# Altium footprint library main.PcbLib: 208 footprints (part 11 of 13)
Each footprint in its own frame and in the unit in brackets; x right, y up, seen from the top. Pads: shape width x height; smd on the part's side, far side on the other; paste and mask are expansions set on the pad; w line width, h text height; cw(c..) or ccw(c..) is an arc to the next point about the centre after c.
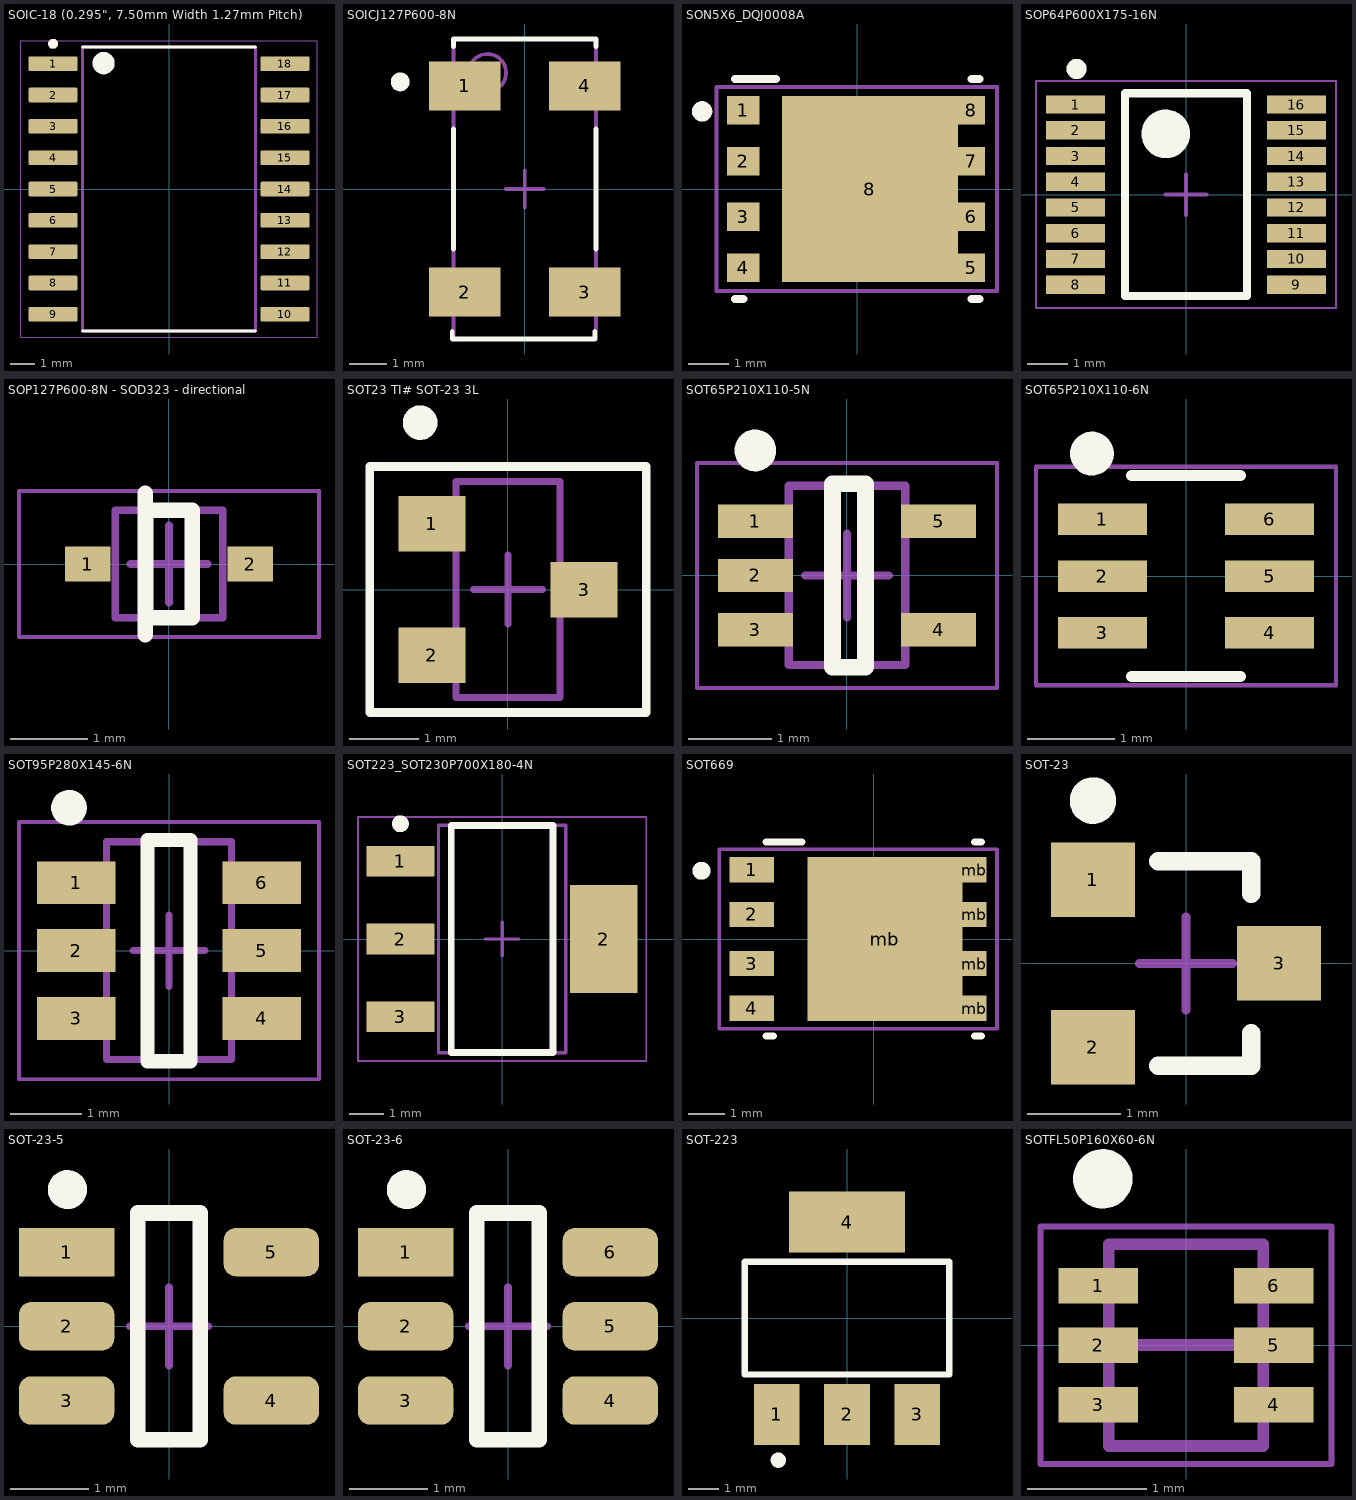
[diagram p10: the footprints below, top view; thin cyan lines are the x and y axes]

## SOIC-18 (0.295", 7.50mm Width 1.27mm Pitch) [mm] "SOIC-18 (0.295\", 7.50mm Width 1.27mm Pitch)"
height 1.1
pads (18):
  rrect25% 2x0.6 smd: 1(-4.7,5.08) 2(-4.7,3.81) 3(-4.7,2.54) 4(-4.7,1.27) 5(-4.7,0) 6(-4.7,-1.27) 7(-4.7,-2.54) 8(-4.7,-3.81) 9(-4.7,-5.08) 10(4.7,-5.08) 11(4.7,-3.81) 12(4.7,-2.54) 13(4.7,-1.27) 14(4.7,0) 15(4.7,1.27) 16(4.7,2.54) 17(4.7,3.81) 18(4.7,5.08)
Top Overlay:
  circle w0.6: c-2.65,5.1 r0.15
  circle w0.2: c-4.7,5.885 r0.1
  lines w0.127: -3.5,-5.75 3.5,-5.75 ; -3.5,5.75 3.5,5.75
Mechanical 7:
  text ".Designator" at -1.85,-0.35 h1.52
Mechanical 13:
  circle w0.2: c-4.7,5.885 r0.1
  lines w0.127: -3.5,-5.75 -3.5,5.75 3.5,5.75 3.5,-5.75 -3.5,-5.75
Mechanical 15:
  lines w0.05: -6,-6 -6,6 6,6 6,-6 -6,-6
3D body "User Library-SO-18W.STEP": height 2.48, standoff 0, extent -5.155,-5.79 5.155,5.79

## SOICJ127P600-8N [mm] "Crystal - ABS25 32.768kHz"
height 2.5
pads (4):
  rect 1.9x1.3 smd: 1(-1.6,2.75) 2(-1.6,-2.75) 3(1.6,-2.75) 4(1.6,2.75)
Top Overlay:
  circle w0.25: c-3.324,2.856 r0.125
  lines w0.127: -1.934,-3.8 -1.934,-4 1.866,-4 1.866,-3.8 ; -1.9,-1.6 -1.9,1.6 ; -1.9,3.8 -1.9,4 1.9,4 1.9,3.8 ; 1.9,-1.6 1.9,1.6
Mechanical 7:
  text ".Designator" at -1.969,-0.719 h1.52
Mechanical 13:
  circle w0.1: c-1,3.1 r0.5
  lines w0.1: -1.9,-4 -1.9,4 1.9,4 1.9,-4 -1.9,-4
Mechanical 15:
  lines w0.05: -1.9,-4 -1.9,4 1.9,4 1.9,-4 -1.9,-4
  lines w0.1: -0.5,0 0.5,0 ; -0.483,0 0.482,0 ; 0,-0.5 0,0.5 ; 0,-0.381 0,0.381
3D body: height 2.5, standoff 0.1, extent -1.9,-4 1.9,4

## SON5X6_DQJ0008A [mm] "TI SON5X6 package MOSFET"
height 0.025
pads (9):
  rect 0.8x0.7 smd paste-0.09: 1(-2.795,1.93) 2(-2.795,0.685) 3(-2.795,-0.685) 4(-2.795,-1.93)
  rect 0.68x0.7 smd paste-0.09: 5(2.795,-1.93) 6(2.795,-0.685) 7(2.795,0.685) 8(2.795,1.93)
  rect 4.32x4.56 smd paste+0: 8(0.308,0)
Top Overlay:
  circle w0.25: c-3.81,1.905 r0.125
  lines w0.2: -3,-2.7 -2.8,-2.7 ; -3,2.7 -2,2.7 ; 2.8,-2.7 3,-2.7 ; 2.8,2.7 3,2.7
Top Paste:
  rectangle: 0.693,-1.955 1.927,-0.385
  rectangle: 0.693,0.385 1.927,1.955
  rectangle: -1.392,-1.955 0.193,-0.385
  rectangle: -1.392,0.385 0.193,1.955
Top Solder:
  region: -1.189,-2.193 -1.19,-2.183 -1.19,2.183 -1.189,2.193 -1.186,2.203 -1.181,2.212 -1.175,2.22 -1.167,2.226 -1.158,2.231 -1.148,2.234 -1.138,2.235 2.238,2.235 2.248,2.234 2.258,2.231 2.267,2.226 2.275,2.22 2.281,2.212 2.286,2.203 2.289,2.193 2.29,2.183 2.29,-2.183 2.289,-2.193 2.286,-2.203 2.281,-2.212 2.275,-2.22 2.267,-2.226 2.258,-2.231 2.248,-2.234 2.238,-2.235 -1.138,-2.235 -1.148,-2.234 -1.158,-2.231 -1.167,-2.226 -1.175,-2.22 -1.181,-2.212 -1.186,-2.203
  region: 2.25,0.84 2.25,0.43 2.475,0.43 2.475,0.84
  region: 2.25,2.11 2.25,1.7 2.475,1.7 2.475,2.11
  region: 2.25,-1.7 2.25,-2.11 2.475,-2.11 2.475,-1.7
  region: 2.25,-0.43 2.25,-0.84 2.475,-0.84 2.475,-0.43
Mechanical 7:
  text ".Designator" at -2.413,-1.778 h1.52
Mechanical 15:
  lines w0.1: -3.457,-2.5 3.429,-2.5 3.429,2.5 -3.457,2.5 -3.457,-2.5
3D body "DQJ0008A.stp": height 1.15, standoff 0, extent -3.175,-2.436 3.085,2.464

## SOP64P600X175-16N [mm] "FT230XS-R SOP, 16-Leads, Body 4.90x3.90mm, Pitch 0.64mm, IPC Medium Density"
height 1.76
pads (16):
  rect 1.45x0.45 smd: 1(-2.725,2.222) 2(-2.725,1.587) 3(-2.725,0.953) 4(-2.725,0.318) 5(-2.725,-0.318) 6(-2.725,-0.953) 7(-2.725,-1.587) 8(-2.725,-2.222) 9(2.725,-2.222) 10(2.725,-1.587) 11(2.725,-0.953) 12(2.725,-0.318) 13(2.725,0.318) 14(2.725,0.953) 15(2.725,1.587) 16(2.725,2.222)
Top Overlay:
  circle w0.6: c-0.5,1.5 r0.3
  circle w0.25: c-2.7,3.1 r0.125
  lines w0.2: -1.5,-2.5 1.5,-2.5 1.5,2.5 -1.5,2.5 -1.5,-2.5
Mechanical 7:
  text ".Designator" at -1.295,-0.74 h0.76
Mechanical 15:
  lines w0.05: -3.7,-2.8 3.7,-2.8 3.7,2.8 -3.7,2.8 -3.7,-2.8
  lines w0.1: -0.5,0 0.5,0 ; 0,-0.5 0,0.5
3D body "User Library-SSOP16.STEP": height 1.05, standoff -0.05, extent -2.997,-2.439 2.997,2.539

## SOP127P600-8N - SOD323 - directional [mm] "SOD323 - directional"
height 1.1
pads (2):
  rect 0.59x0.45 smd: 1(-1.055,0) 2(1.055,0)
Top Overlay:
  lines w0.2: -0.31,-0.92 -0.31,0.92 ; -0.3,-0.7 -0.3,0.7 0.3,0.7 0.3,-0.7 -0.3,-0.7
Mechanical 7:
  text ".Designator" at -1.143,-0.254 h0.76
Mechanical 13:
  lines w0.1: -0.7,-0.7 -0.7,0.7 0.7,0.7 0.7,-0.7 -0.7,-0.7
Mechanical 15:
  lines w0.05: -1.95,-0.95 -1.95,0.95 1.95,0.95 1.95,-0.95 -1.95,-0.95
  lines w0.1: -0.5,0 0.5,0 ; 0,-0.5 0,0.5
3D body: height 1.1, standoff 0.1, extent -0.7,-0.7 0.7,0.7

## SOT23 TI# SOT-23 3L [mm] "SOT23, 3-Leads, Body 2.92x2.40mm, Pitch 0.95mm, IPC Medium Density"
height 1.2
pads (3):
  rect 0.972x0.802 smd: 1(-1.1,0.95) 2(-1.1,-0.95) 3(1.1,0)
Top Overlay:
  circle w0.25: c-1.27,2.413 r0.125
  lines w0.127: -2,-1.778 2,-1.778 2,1.778 -2,1.778 -2,-1.778
Mechanical 7:
  text ".Designator" at -1.778,-0.762 h1.52
Mechanical 13:
  lines w0.1: -0.75,-1.56 -0.75,1.56 0.75,1.56 0.75,-1.56 -0.75,-1.56
Mechanical 15:
  lines w0.05: -2,-1.8 -2,1.8 2,1.8 2,-1.8 -2,-1.8
  lines w0.1: -0.5,0 0.5,0 ; 0,-0.5 0,0.5
3D body: height 1.2, standoff 0.1, extent -0.75,-1.56 0.75,1.56

## SOT65P210X110-5N [mm] "SOT23, 5-Leads, Body 2.00x2.10mm, Pitch 0.65mm, IPC Medium Density"
height 1.1
pads (5):
  rect 0.9x0.4 smd: 1(-1.1,0.65) 2(-1.1,0) 3(-1.1,-0.65) 4(1.1,-0.65) 5(1.1,0.65)
Top Overlay:
  circle w0.25: c-1.1,1.5 r0.125
  lines w0.2: -0.175,-1.1 0.222,-1.1 0.222,1.1 -0.175,1.1 -0.175,-1.1
Mechanical 7:
  text ".Designator" at -1.247,-0.236 h0.76
Mechanical 13:
  lines w0.1: -0.7,-1.075 -0.7,1.075 0.7,1.075 0.7,-1.075 -0.7,-1.075
Mechanical 15:
  lines w0.05: -1.8,-1.35 -1.8,1.35 1.8,1.35 1.8,-1.35 -1.8,-1.35
  lines w0.1: -0.5,0 0.5,0 ; 0,-0.5 0,0.5
3D body: height 1.1, standoff 0.1, extent -0.7,-1.075 0.7,1.075

## SOT65P210X110-6N [mm]
pads (6):
  rect 1.02x0.36 smd: 1(-0.955,0.65) 2(-0.955,0) 3(-0.955,-0.65) 4(0.955,-0.65) 5(0.955,0) 6(0.955,0.65)
Top Overlay:
  circle w0.25: c-1.075,1.4 r0.125
  lines w0.127: -0.625,-1.15 0.625,-1.15 ; -0.625,1.15 0.625,1.15
Mechanical 7:
  text ".Designator" at -1.016,-0.381 h0.76
Mechanical 15:
  lines w0.05: -1.715,-1.25 1.715,-1.25 1.715,1.25 -1.715,1.25 -1.715,-1.25
3D body "User Library-SOT363-2.STEP": height 1.1, standoff 0, extent -1.2,-1.1 1.2,1.1

## SOT95P280X145-6N [mm] "SOT23, 6-Leads, Body 2.90x2.80mm, Pitch 0.95mm, IPC Medium Density"
height 1.45
pads (6):
  rect 1.1x0.6 smd: 1(-1.3,0.95) 2(-1.3,0) 3(-1.3,-0.95) 4(1.3,-0.95) 5(1.3,0) 6(1.3,0.95)
Top Overlay:
  circle w0.25: c-1.4,2 r0.125
  lines w0.2: -0.3,-1.55 -0.3,1.55 0.3,1.55 0.3,-1.55 -0.3,-1.55
Mechanical 7:
  text ".Designator" at -1.448,-0.136 h0.76
Mechanical 13:
  lines w0.1: -0.875,-1.525 0.875,-1.525 0.875,1.525 -0.875,1.525 -0.875,-1.525
Mechanical 15:
  lines w0.05: -2.1,-1.8 2.1,-1.8 2.1,1.8 -2.1,1.8 -2.1,-1.8
  lines w0.1: -0.5,0 0.5,0 ; 0,-0.5 0,0.5
3D body: height 1.45, standoff 0.25, extent -0.875,-1.525 0.875,1.525

## SOT223_SOT230P700X180-4N [mm] "SOT223, 4-Leads, Body 6.50x7.00mm (avg), Pitch 2.30mm, IPC Medium Density"
height 1.8
pads (4):
  rect 2x0.9 smd: 1(-3,2.3) 2(-3,0) 3(-3,-2.3)
  rect 2x3.2 smd: 2(3,0)
Top Overlay:
  circle w0.25: c-3,3.4 r0.125
  lines w0.2: -1.5,-3.35 -1.5,3.35 1.5,3.35 1.5,-3.35 -1.5,-3.35
Mechanical 7:
  text ".Designator" at -2.286,-0.508 h1.52
Mechanical 13:
  lines w0.1: -1.875,-3.35 -1.875,3.35 1.875,3.35 1.875,-3.35 -1.875,-3.35
Mechanical 15:
  lines w0.05: -4.25,-3.6 -4.25,3.6 4.25,3.6 4.25,-3.6 -4.25,-3.6
  lines w0.1: -0.5,0 0.5,0 ; 0,-0.5 0,0.5
3D body: height 1.8, standoff 0.02, extent -1.875,-3.35 1.875,3.35

## SOT669 [mm] "SOT669"
height 0.025
pads (9):
  rect 1.25x0.7 smd paste-0.09: 1(-3.4,1.93) 2(-3.4,0.685) 3(-3.4,-0.685) 4(-3.4,-1.93)
  rect 4.32x4.56 smd paste+0: mb(0.308,0)
  rect 0.68x0.7 smd paste-0.09: mb(2.795,-1.93) mb(2.795,-0.685) mb(2.795,0.685) mb(2.795,1.93)
Top Overlay:
  circle w0.25: c-4.8,1.9 r0.125
  lines w0.2: -3,-2.7 -2.8,-2.7 ; -3,2.7 -2,2.7 ; 2.8,-2.7 3,-2.7 ; 2.8,2.7 3,2.7
Top Paste:
  rectangle: -1.392,0.385 0.193,1.955
  rectangle: -1.392,-1.955 0.193,-0.385
  rectangle: 0.693,0.385 1.927,1.955
  rectangle: 0.693,-1.955 1.927,-0.385
Top Solder:
  region: 2.25,-0.43 2.25,-0.84 2.475,-0.84 2.475,-0.43
  region: 2.25,-1.7 2.25,-2.11 2.475,-2.11 2.475,-1.7
  region: 2.25,2.11 2.25,1.7 2.475,1.7 2.475,2.11
  region: 2.25,0.84 2.25,0.43 2.475,0.43 2.475,0.84
  region: -1.189,-2.193 -1.19,-2.183 -1.19,2.183 -1.189,2.193 -1.186,2.203 -1.181,2.212 -1.175,2.22 -1.167,2.226 -1.158,2.231 -1.148,2.234 -1.138,2.235 2.238,2.235 2.248,2.234 2.258,2.231 2.267,2.226 2.275,2.22 2.281,2.212 2.286,2.203 2.289,2.193 2.29,2.183 2.29,-2.183 2.289,-2.193 2.286,-2.203 2.281,-2.212 2.275,-2.22 2.267,-2.226 2.258,-2.231 2.248,-2.234 2.238,-2.235 -1.138,-2.235 -1.148,-2.234 -1.158,-2.231 -1.167,-2.226 -1.175,-2.22 -1.181,-2.212 -1.186,-2.203
Mechanical 7:
  text ".Designator" at -2.413,-1.778 h1.52
Mechanical 15:
  lines w0.1: -4.3,-2.5 -4.3,2.5 3.429,2.5 3.429,-2.5 -4.3,-2.5
3D body "SOT669.step": height 1, standoff 0, extent -3.3,-2.405 2.81,2.405

## SOT-23 [mm]
height 1.1
pads (3):
  rect 0.9x0.8 smd: 1(-1,0.9) 2(-1,-0.9) 3(1,0)
Top Overlay:
  circle w0.25: c-1,1.75 r0.125
  lines w0.2: -0.3,-1.1 0.7,-1.1 0.7,-0.75 ; -0.3,1.1 0.7,1.1 0.7,0.75
Mechanical 15:
  lines w0.1: -0.5,0 0.5,0 ; 0,-0.5 0,0.5
3D body "SW3DPS-SOT-23-DEFAULT.STEP": height 1.05, standoff -0.05, extent -1.25,-1.5 1.25,1.5

## SOT-23-5 [mm]
height 1.1
pads (5):
  rect 1.22x0.62 smd: 1(-1.31,0.95)
  rrect50% 1.22x0.62 smd: 2(-1.31,0) 3(-1.31,-0.95) 4(1.31,-0.95) 5(1.31,0.95)
Top Overlay:
  circle w0.25: c-1.3,1.75 r0.125
  lines w0.2: -0.4,-1.45 0.4,-1.45 0.4,1.45 -0.4,1.45 -0.4,-1.45
Mechanical 15:
  lines w0.1: -0.5,0 0.5,0 ; 0,-0.5 0,0.5
3D body "User Library-SOT23-5-2.STEP": height 1.45, standoff 0, extent -1.4,-1.45 1.4,1.45

## SOT-23-6 [mm]
height 1.1
pads (6):
  rect 1.22x0.62 smd: 1(-1.31,0.95)
  rrect50% 1.22x0.62 smd: 2(-1.31,0) 3(-1.31,-0.95) 4(1.31,-0.95) 5(1.31,0) 6(1.31,0.95)
Top Overlay:
  circle w0.25: c-1.3,1.75 r0.125
  lines w0.2: -0.4,-1.45 0.4,-1.45 0.4,1.45 -0.4,1.45 -0.4,-1.45
Mechanical 15:
  lines w0.1: -0.5,0 0.5,0 ; 0,-0.5 0,0.5
3D body "User Library-SOT23-6-2.STEP": height 1.45, standoff 0, extent -1.4,-1.45 1.4,1.45

## SOT-223 [mm]
height 1.1
pads (4):
  rect 1.5x2 smd: 1(-2.3,-3.15) 2(0,-3.15) 3(2.3,-3.15)
  rect 3.8x2 smd: 4(0,3.15)
Top Overlay:
  circle w0.25: c-2.25,-4.65 r0.125
  lines w0.2: -3.35,-1.85 -3.35,1.85 3.35,1.85 3.35,-1.85 -3.35,-1.85
Mechanical 15:
  lines w0.1: -0.5,-3.15 0.5,-3.15 ; 0,-3.65 0,-2.65
3D body "User Library-SOT-223-4.STEP": height 1.65, standoff 0, extent -3.25,-3.543 3.25,3.544

## SOTFL50P160X60-6N [mm] "SOTFL, 6-Leads, Body 1.60x1.60mm, Pitch 0.50mm, IPC Medium Density"
height 0.6
pads (6):
  rect 0.67x0.3 smd: 1(-0.74,0.5) 2(-0.74,0) 3(-0.74,-0.5) 4(0.74,-0.5) 5(0.74,0) 6(0.74,0.5)
Top Overlay:
  circle w0.25: c-0.7,1.4 r0.125
Mechanical 7:
  text ".Designator" at -0.74,-0.5 h0.6
Mechanical 13:
  lines w0.1: -0.65,-0.85 -0.65,0.85 0.65,0.85 0.65,-0.85 -0.65,-0.85
Mechanical 15:
  lines w0.05: -1.225,-1 -1.225,1 1.225,1 1.225,-1 -1.225,-1
  lines w0.1: -0.5,0 0.5,0
3D body: height 0.6, standoff 0, extent -0.65,-0.85 0.65,0.85